# Altium footprint library 10A_Motor_Driver.PcbLib: 68 footprints (part 5 of 5)
Each footprint in its own frame and in the unit in brackets; x right, y up, seen from the top. Pads: shape width x height; smd on the part's side, far side on the other; paste and mask are expansions set on the pad; w line width, h text height; cw(c..) or ccw(c..) is an arc to the next point about the centre after c.
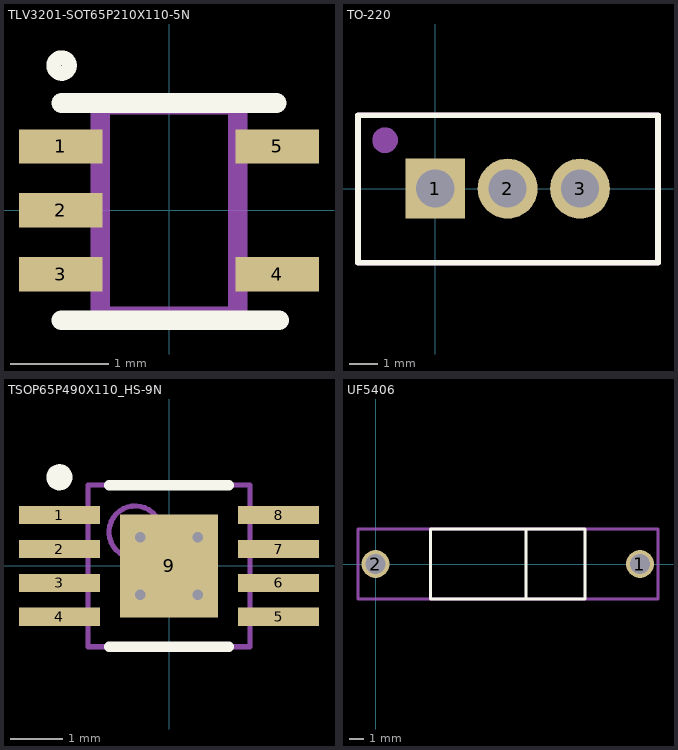
[diagram p4: the footprints below, top view; thin cyan lines are the x and y axes]

## TLV3201-SOT65P210X110-5N [mm] "SOT23, 5-Leads, Body 2,00x2,10mm, Pitch 0,65mm, IPC Medium Density"
height 1.1
pads (5):
  rect 0.85x0.35 smd: 1(-1.1,0.65) 2(-1.1,0) 3(-1.1,-0.65) 4(1.1,-0.65) 5(1.1,0.65)
Top Overlay:
  circle w0.15: c-1.092,1.473 r0.08
  lines w0.2: -1.092,-1.118 1.118,-1.118 ; -1.092,1.092 1.092,1.092
Top Assembly (Mech29):
  lines w0.2: -0.7,-1.075 0.7,-1.075 0.7,1.075 -0.7,1.075 -0.7,-1.075
3D body "TLV3201-SOT65P210X110-5N.step": height 1.1, standoff 0, extent -1.2,-1.075 1.2,1.075

## TO-220 [mm]
pads (3):
  rect 2.1x2.1 hole 1.34: 1(0,0)
  round 2.1 hole 1.34: 2(2.54,0) 3(5.08,0)
Top Overlay:
  lines w0.2: -2.71,-2.6 7.815,-2.6 7.815,2.575 -2.71,2.575 -2.71,-2.6
Top Assembly (Mech29):
  circle w0.5: c-1.76,1.7 r0.2
  lines w0.2: -2.71,-2.6 -2.71,2.575 7.815,2.575 7.815,-2.6 -2.71,-2.6
  text ".Designator" at 2.69,0.466 h2
3D body "User Library-POWER MOSFET, NON-SURFACE-MOUNT.step": height 18.66, standoff -9.72, extent -2.286,-2.15 7.366,2.35

## TSOP65P490X110_HS-9N [mm] "TSOP, 8-Leads, Body 3,00x3,00mm, Pitch 0,65mm, Thermal Pad 1,98x1,88mm, IPC Medium Density"
height 1.1
pads (9):
  rect 1.55x0.35 smd: 1(-2.1,0.975) 2(-2.1,0.325) 3(-2.1,-0.325) 4(-2.1,-0.975) 5(2.1,-0.975) 6(2.1,-0.325) 7(2.1,0.325) 8(2.1,0.975)
  rect 1.88x1.98 smd: 9(0,0)
via -0.55,0.55 diameter 0.5 hole 0.2
via 0.55,0.55 diameter 0.5 hole 0.2
via -0.55,-0.55 diameter 0.5 hole 0.2
via 0.55,-0.55 diameter 0.5 hole 0.2
Top Overlay:
  circle w0.25: c-2.1,1.7 r0.125
  lines w0.2: -1.15,-1.55 1.15,-1.55 ; -1.15,1.55 1.15,1.55
Top Assembly (Mech29):
  circle w0.1: c-0.65,0.65 r0.5
  lines w0.1: -1.55,-1.55 -1.55,1.55 1.55,1.55 1.55,-1.55 -1.55,-1.55
3D body "TSOP65P490X110_HS-9N.step": height 1.1, standoff 0, extent -2.45,-1.55 2.45,1.55

## UF5406 [mm]
pads (2):
  round 2 hole 1.4: 1(18.84,0) 2(0,0)
Top Overlay:
  lines w0.2: 3.925,-0.279 3.925,2.5 14.915,2.5 14.915,-2.5 3.925,-2.5 3.925,0 ; 10.728,-2.5 10.728,2.5
Top Assembly (Mech29):
  lines w0.2: -1.25,-2.5 20.125,-2.5 20.125,2.5 -1.25,2.5 -1.25,-2.5
  text ".Designator" at 7.01,-2.124 h2
3D body "User Library-DO-201ADDO-27.step": height 6.82, standoff -2.8, extent -0.66,-2.82 19.48,2.82